# Altium footprint library 5-C-THD.PcbLib: 166 footprints (part 6 of 11)
Each footprint in its own frame and in the unit in brackets; x right, y up, seen from the top. Pads: shape width x height; smd on the part's side, far side on the other; paste and mask are expansions set on the pad; w line width, h text height; cw(c..) or ccw(c..) is an arc to the next point about the centre after c.
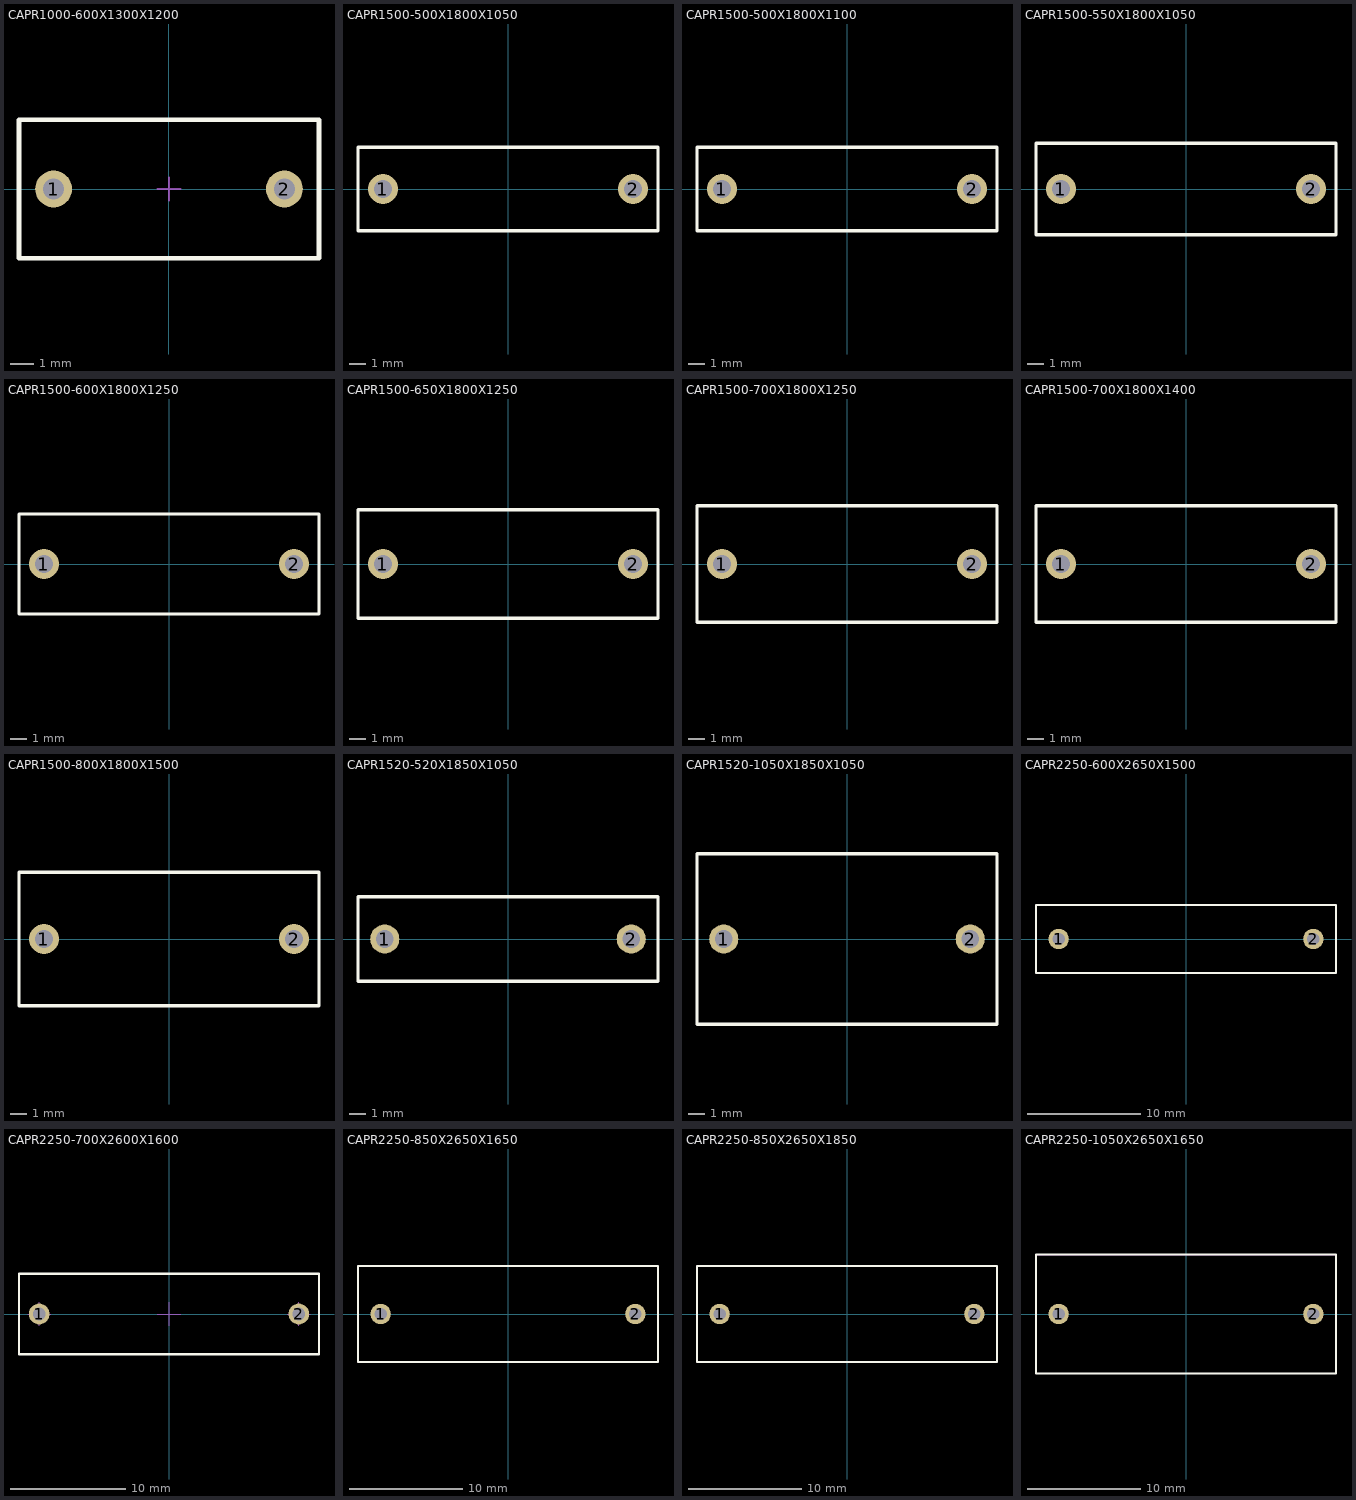
[diagram p5: the footprints below, top view; thin cyan lines are the x and y axes]

## CAPR1000-600X1300X1200 [mm] "Capacitor Radial, Pin spacing 10mm - Body With 6mm X Body Length 13mm X Body Height 12mm"
height 12
pads (2):
  round 1.6 hole 0.9: 1(-5,0) 2(5,0)
Top Overlay:
  lines w0.2: -6.5,-3 -6.5,3 6.5,3 6.5,-3 -6.5,-3
Mechanical 8:
  lines w0.1: -5.5,0 -5,0 ; -5,-0.5 -5,0 ; -5,0.5 -5,0 ; -4.5,0 -5,0 ; -0.5,0 0,0 ; 0,-0.5 0,0 ; 0,0.5 0,0 ; 0.5,0 0,0 ; 4.5,0 5,0 ; 5,-0.5 5,0 ; 5,0.5 5,0 ; 5.5,0 5,0
Mechanical 14:
  lines w0.1: -6.5,-3 -6.5,3 6.5,3 6.5,-3 -6.5,-3
3D body "CAPR1000-600X1300X1200.stp": height 12, standoff -3.8, extent -6.5,-3 6.5,3

## CAPR1500-500X1800X1050 [mm] "Capacitor Radial, Pin spacing 15.0mm - Body With 5mm X Body Length 18mm X Body Height 10.5mm"
height 10.5
pads (2):
  round 1.8 hole 1.1: 1(-7.5,0) 2(7.5,0)
Top Overlay:
  lines w0.2: -9,-2.5 -9,2.5 9,2.5 9,-2.5 -9,-2.5
Mechanical 13:
  lines w0.1: -9,-2.5 9,-2.5 9,2.5 -9,2.5 -9,-2.5
Mechanical 14:
  lines w0.1: -9,-2.5 -9,2.5 9,2.5 9,-2.5 -9,-2.5
3D body "CAPR1500-500X1800X1050.stp": height 10.5, standoff -3.8, extent -8.999,-2.499 9.001,2.501

## CAPR1500-500X1800X1100 [mm] "Capacitor Radial, Pin spacing 15.0mm - Body With 5mm X Body Length 18mm X Body Height 11mm"
height 11
pads (2):
  round 1.8 hole 1.1: 1(-7.5,0) 2(7.5,0)
Top Overlay:
  lines w0.2: -9,-2.5 9,-2.5 9,2.5 -9,2.5 -9,-2.5
Mechanical 13:
  lines w0.1: -9,-2.5 -9,2.5 9,2.5 9,-2.5 -9,-2.5
Mechanical 14:
  lines w0.1: -9,-2.5 9,-2.5 9,2.5 -9,2.5 -9,-2.5
3D body "CAPR1500-500X1800X1100.stp": height 11, standoff -3.8, extent -8.999,-2.5 9.001,2.5

## CAPR1500-550X1800X1050 [mm] "Capacitor Radial, Pin spacing 15.0mm - Body With 5.5mm X Body Length 18mm X Body Height 10.5mm"
height 10.5
pads (2):
  round 1.8 hole 1.1: 1(-7.5,0) 2(7.5,0)
Top Overlay:
  lines w0.2: -9,-2.75 9,-2.75 9,2.75 -9,2.75 -9,-2.75
Mechanical 13:
  lines w0.1: -9,-2.75 -9,2.75 9,2.75 9,-2.75 -9,-2.75
Mechanical 14:
  lines w0.1: -9,-2.75 9,-2.75 9,2.75 -9,2.75 -9,-2.75
3D body "CAPR1500-550X1800X1050.stp": height 10.5, standoff -3.5, extent -8.999,-2.75 9.001,2.75

## CAPR1500-600X1800X1250 [mm] "Capacitor Radial, Pin spacing 15.0mm - Body With 6mm X Body Length 18mm X Body Height 12.5mm"
height 12.5
pads (2):
  round 1.8 hole 1.1: 1(-7.5,0) 2(7.5,0)
Top Overlay:
  lines w0.2: -9,-3 -9,3 9,3 9,-3 -9,-3
Mechanical 13:
  lines w0.1: -9,-3 9,-3 9,3 -9,3 -9,-3
Mechanical 14:
  lines w0.1: -9,-3 -9,3 9,3 9,-3 -9,-3
3D body "CAPR1500-600X1800X1250.stp": height 12.5, standoff -3.8, extent -9,-3 9,3

## CAPR1500-650X1800X1250 [mm] "Capacitor Radial, Pin spacing 15.0mm - Body With 6.5mm X Body Length 18mm X Body Height 12.5mm"
height 12.5
pads (2):
  round 1.8 hole 1.1: 1(-7.5,0) 2(7.5,0)
Top Overlay:
  lines w0.2: -9,-3.25 9,-3.25 9,3.25 -9,3.25 -9,-3.25
Mechanical 13:
  lines w0.1: -9,-3.25 -9,3.25 9,3.25 9,-3.25 -9,-3.25
Mechanical 14:
  lines w0.1: -9,-3.25 9,-3.25 9,3.25 -9,3.25 -9,-3.25
3D body "CAPR1500-650X1800X1250.stp": height 12.8, standoff -3.5, extent -9,-3.25 9,3.25

## CAPR1500-700X1800X1250 [mm] "Capacitor Radial, Pin spacing 15.0mm - Body With 7mm X Body Length 18mm X Body Height 12.5mm"
height 12.5
pads (2):
  round 1.8 hole 1.1: 1(-7.5,0) 2(7.5,0)
Top Overlay:
  lines w0.2: -9,-3.5 -9,3.5 9,3.5 9,-3.5 -9,-3.5
Mechanical 13:
  lines w0.1: -9,-3.5 9,-3.5 9,3.5 -9,3.5 -9,-3.5
Mechanical 14:
  lines w0.1: -9,-3.5 -9,3.5 9,3.5 9,-3.5 -9,-3.5
3D body "CAPR1500-700X1800X1250.stp": height 12.5, standoff -3.8, extent -8.999,-3.499 9.001,3.501

## CAPR1500-700X1800X1400 [mm] "Capacitor Radial, Pin spacing 15.0mm - Body With 7mm X Body Length 18mm X Body Height 14mm"
height 14
pads (2):
  round 1.8 hole 1.1: 1(-7.5,0) 2(7.5,0)
Top Overlay:
  lines w0.2: -9,-3.5 9,-3.5 9,3.5 -9,3.5 -9,-3.5
Mechanical 13:
  lines w0.1: -9,-3.5 -9,3.5 9,3.5 9,-3.5 -9,-3.5
Mechanical 14:
  lines w0.1: -9,-3.5 9,-3.5 9,3.5 -9,3.5 -9,-3.5
3D body "CAPR1500-700X1800X1400.stp": height 14, standoff -3.8, extent -8.999,-3.499 9.001,3.501

## CAPR1500-800X1800X1500 [mm] "Capacitor Radial, Pin spacing 15.0mm - Body With 8mm X Body Length 18mm X Body Height 15mm"
height 15
pads (2):
  round 1.8 hole 1.1: 1(-7.5,0) 2(7.5,0)
Top Overlay:
  lines w0.2: -9,-4 -9,4 9,4 9,-4 -9,-4
Mechanical 13:
  lines w0.1: -9,-4 9,-4 9,4 -9,4 -9,-4
Mechanical 14:
  lines w0.1: -9,-4 -9,4 9,4 9,-4 -9,-4
3D body "CAPR1500-800X1800X1500.stp": height 15, standoff -3.8, extent -8.999,-4 9.001,4

## CAPR1520-520X1850X1050 [mm] "Capacitor Radial, Pin spacing 15.2mm - Body With 5.2mm X Body Length 18.5mm X Body Height 10.5mm"
height 10.5
pads (2):
  round 1.8 hole 1.1: 1(-7.6,0) 2(7.6,0)
Top Overlay:
  lines w0.2: -9.25,-2.6 -9.25,2.6 9.25,2.6 9.25,-2.6 -9.25,-2.6
Mechanical 13:
  lines w0.1: -9.25,-2.6 9.25,-2.6 9.25,2.6 -9.25,2.6 -9.25,-2.6
Mechanical 14:
  lines w0.1: -9.25,-2.6 -9.25,2.6 9.25,2.6 9.25,-2.6 -9.25,-2.6
3D body "CAPR1520-520X1850X1050.stp": height 10.5, standoff -3.8, extent -9.249,-2.6 9.251,2.6

## CAPR1520-1050X1850X1050 [mm] "Capacitor Radial, Pin spacing 15.2mm - Body With 10.5mm X Body Length 18.5mm X Body Height 10.5mm"
height 10.5
pads (2):
  round 1.8 hole 1.1: 1(-7.6,0) 2(7.6,0)
Top Overlay:
  lines w0.2: -9.25,-5.25 -9.25,5.25 9.25,5.25 9.25,-5.25 -9.25,-5.25
Mechanical 13:
  lines w0.1: -9.25,-5.25 9.25,-5.25 9.25,5.25 -9.25,5.25 -9.25,-5.25
Mechanical 14:
  lines w0.1: -9.25,-5.25 -9.25,5.25 9.25,5.25 9.25,-5.25 -9.25,-5.25
3D body "CAPR1520-1050X1850X1050.stp": height 10.5, standoff -3.8, extent -9.249,-5.249 9.251,5.251

## CAPR2250-600X2650X1500 [mm] "Capacitor Radial, Pin spacing 22.5.0mm - Body With 6mm X Body Length 26.5mm X Body Height 15mm"
height 15
pads (2):
  round 1.8 hole 1.1: 1(-11.25,0) 2(11.25,0)
Top Overlay:
  lines w0.2: -13.25,-3 -13.25,3 13.25,3 13.25,-3 -13.25,-3
Mechanical 13:
  lines w0.1: -13.25,-3 13.25,-3 13.25,3 -13.25,3 -13.25,-3
Mechanical 14:
  lines w0.1: -13.25,-3 -13.25,3 13.25,3 13.25,-3 -13.25,-3
3D body "CAPR2250-600X2650X1500.stp": height 15, standoff -3.8, extent -13.249,-2.999 13.251,3.001

## CAPR2250-700X2600X1600 [mm] "Capacitor Radial, Pin spacing 22.5.0mm - Body With 7mm X Body Length 26.5mm X Body Height 16mm"
height 16
pads (2):
  round 1.8 hole 1.1: 1(-11.25,0) 2(11.25,0)
Top Overlay:
  lines w0.2: -13,-3.5 13,-3.5 13,3.5 -13,3.5 -13,-3.5
Mechanical 8:
  lines w0.1: -12.25,0 -11.25,0 ; -11.25,-1 -11.25,0 ; -11.25,1 -11.25,0 ; -10.25,0 -11.25,0 ; -1,0 0,0 ; 0,-1 0,0 ; 0,1 0,0 ; 1,0 0,0 ; 10.25,0 11.25,0 ; 11.25,-1 11.25,0 ; 11.25,1 11.25,0 ; 12.25,0 11.25,0
Mechanical 14:
  lines w0.1: -13,-3.5 13,-3.5 13,3.5 -13,3.5 -13,-3.5
3D body "CAPR2250-700X2600X1600.stp": height 16, standoff -3.8, extent -13,-3.5 13,3.5

## CAPR2250-850X2650X1650 [mm] "Capacitor Radial, Pin spacing 22.5mm - Body With 8.5mm X Body Length 26.5mm X Body Height 16.5mm"
height 16.5
pads (2):
  round 1.8 hole 1.1: 1(-11.25,0) 2(11.25,0)
Top Overlay:
  lines w0.2: -13.25,-4.25 -13.25,4.25 13.25,4.25 13.25,-4.25 -13.25,-4.25
Mechanical 13:
  lines w0.1: -13.25,-4.25 13.25,-4.25 13.25,4.25 -13.25,4.25 -13.25,-4.25
Mechanical 14:
  lines w0.1: -13.25,-4.25 -13.25,4.25 13.25,4.25 13.25,-4.25 -13.25,-4.25
3D body "CAPR2250-850X2650X1650.stp": height 16.5, standoff -3.8, extent -13.249,-4.249 13.251,4.251

## CAPR2250-850X2650X1850 [mm] "Capacitor Radial, Pin spacing 22.5mm - Body With 8.5mm X Body Length 26.5mm X Body Height 18.5mm"
height 18.5
pads (2):
  round 1.8 hole 1.1: 1(-11.25,0) 2(11.25,0)
Top Overlay:
  lines w0.2: -13.25,-4.25 -13.25,4.25 13.25,4.25 13.25,-4.25 -13.25,-4.25
Mechanical 13:
  lines w0.1: -13.25,-4.25 13.25,-4.25 13.25,4.25 -13.25,4.25 -13.25,-4.25
Mechanical 14:
  lines w0.1: -13.25,-4.25 -13.25,4.25 13.25,4.25 13.25,-4.25 -13.25,-4.25
3D body "CAPR2250-850X2650X1850.stp": height 18.5, standoff -3.8, extent -13.249,-4.249 13.251,4.251

## CAPR2250-1050X2650X1650 [mm] "Capacitor Radial, Pin spacing 22.5mm - Body With 10.5mm X Body Length 26.5mm X Body Height 16.5mm"
height 16.5
pads (2):
  round 1.8 hole 1.1: 1(-11.25,0) 2(11.25,0)
Top Overlay:
  lines w0.2: -13.25,-5.25 13.25,-5.25 13.25,5.25 -13.25,5.25 -13.25,-5.25
Mechanical 13:
  lines w0.1: -13.25,-5.25 -13.25,5.25 13.25,5.25 13.25,-5.25 -13.25,-5.25
Mechanical 14:
  lines w0.1: -13.25,-5.25 13.25,-5.25 13.25,5.25 -13.25,5.25 -13.25,-5.25
3D body "CAPR2250-1050X2650X1650.stp": height 16.5, standoff -3.8, extent -13.249,-5.249 13.251,5.251